# Altium footprint library IC.PcbLib: 386 footprints (part 13 of 30)
Each footprint in its own frame and in the unit in brackets; x right, y up, seen from the top. Pads: shape width x height; smd on the part's side, far side on the other; paste and mask are expansions set on the pad; w line width, h text height; cw(c..) or ccw(c..) is an arc to the next point about the centre after c.
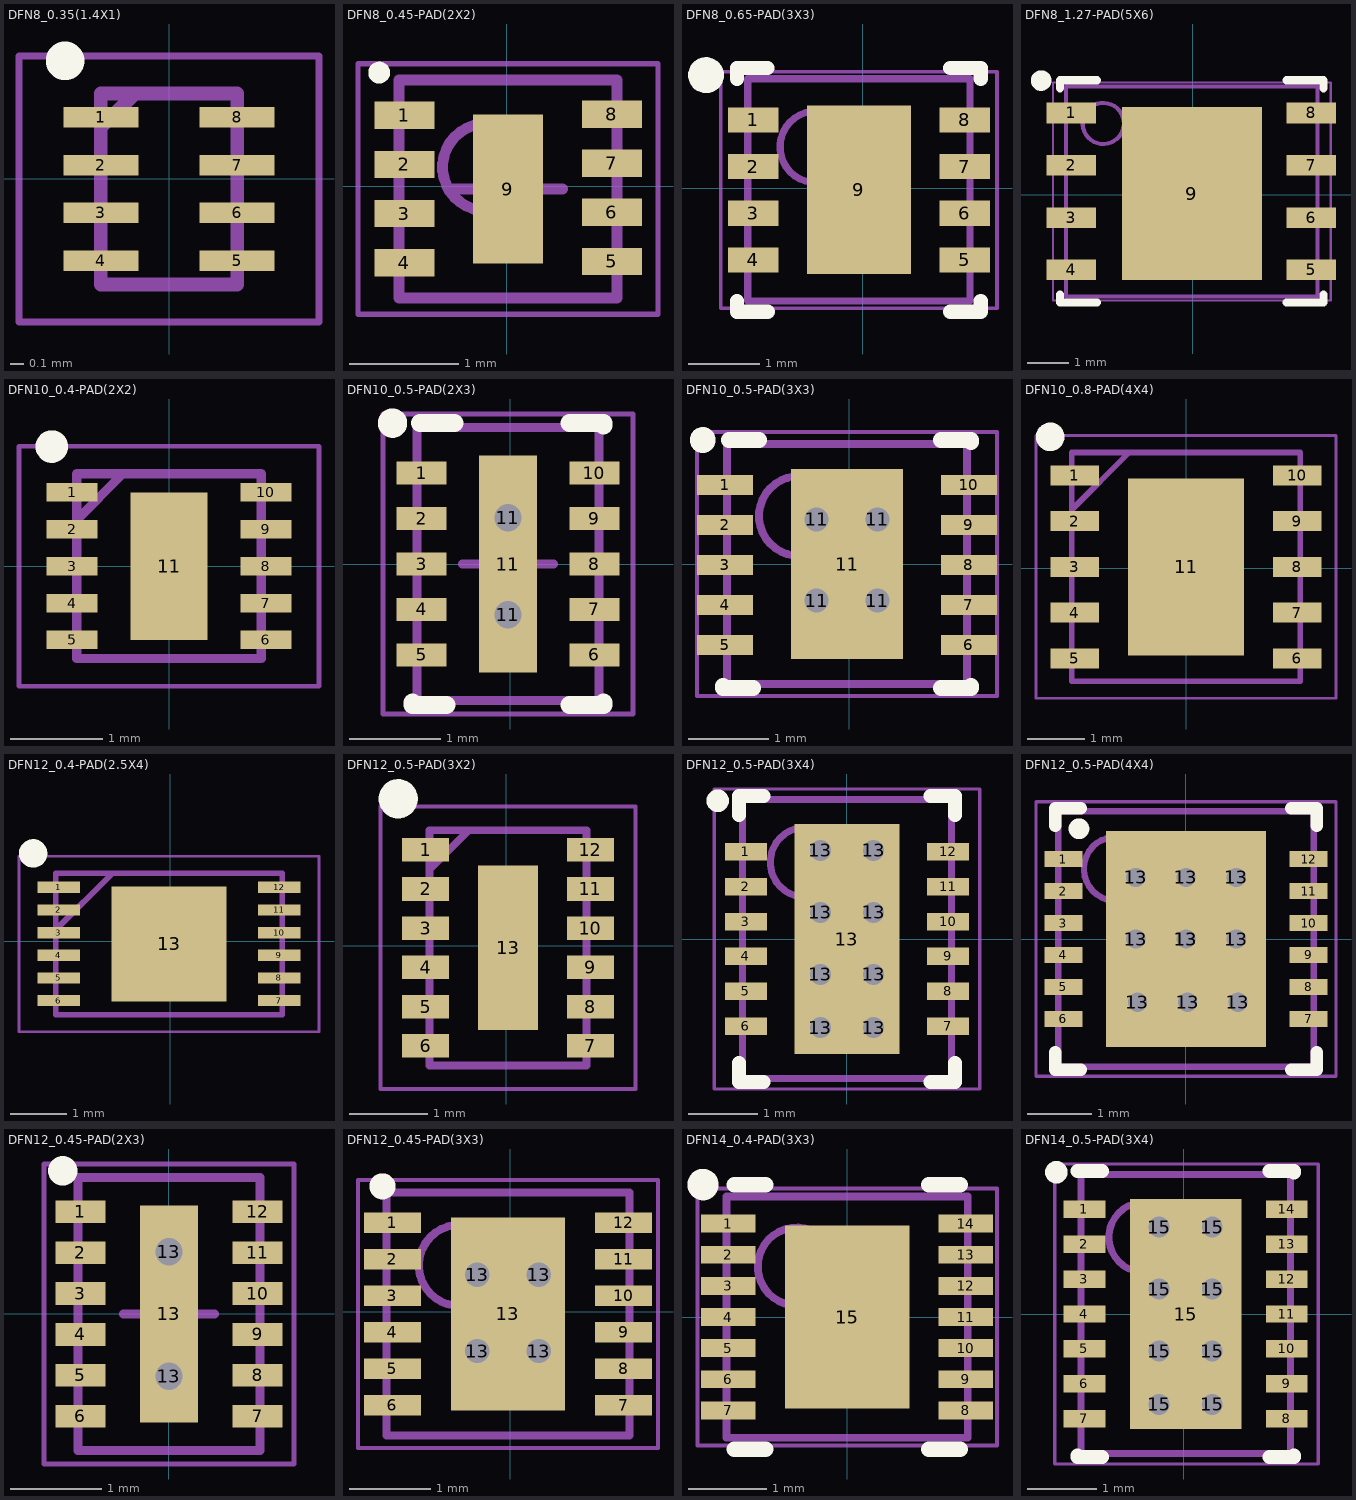
[diagram p12: the footprints below, top view; thin cyan lines are the x and y axes]

## DFN8_0.35(1.4X1) [mm]
pads (8):
  rect 0.55x0.15 smd: 1(-0.5,0.449) 2(-0.5,0.099) 3(-0.5,-0.251) 4(-0.5,-0.601) 5(0.5,-0.601) 6(0.5,-0.251) 7(0.5,0.099) 8(0.5,0.449)
Top Overlay:
  circle w0.25: c-0.762,0.864 r0.016
Mechanical 13:
  lines w0.1: -0.5,0.374 -0.25,0.624 ; -0.5,-0.776 0.5,-0.776 0.5,0.624 -0.5,0.624 -0.5,-0.776
Mechanical 15:
  lines w0.05: -1.1,-1.051 1.1,-1.051 1.1,0.899 -1.1,0.899 -1.1,-1.051
3D body "TXS0102DQER.stp": height 0.4, standoff 0, extent -0.55,-0.776 0.55,0.624

## DFN8_0.45-PAD(2X2) [mm]
pads (9):
  rect 0.55x0.25 smd: 1(-0.938,0.65)
  rect 0.55x0.25 smd mask+0.102: 2(-0.938,0.2) 3(-0.938,-0.25) 4(-0.938,-0.7) 5(0.965,-0.69) 6(0.965,-0.24) 7(0.965,0.21) 8(0.965,0.66)
  rect 0.64x1.37 smd mask+0.102: 9(0.013,-0.025)
Top Overlay:
  circle w0.1: c-1.168,1.041 r0.05
Mechanical 13:
  circle w0.1: c-0.187,0.175 r0.4
  lines w0.1: -0.987,-1.025 1.013,-1.025 1.013,0.975 -0.987,0.975 -0.987,-1.025
Mechanical 15:
  lines w0.05: -1.362,-1.175 1.388,-1.175 1.388,1.125 -1.362,1.125 -1.362,-1.175
  lines w0.1: -0.487,-0.025 0.513,-0.025 ; 0.013,-0.525 0.013,0.475
3D body "User Library-DFN 8.step": height 0.76, standoff -0.04, extent -0.988,-1.025 1.014,0.975

## DFN8_0.65-PAD(3X3) [mm]
pads (9):
  rect 0.7x0.35 smd: 1(-1.526,0.95) 2(-1.526,0.3) 3(-1.526,-0.35) 4(-1.526,-1) 5(1.424,-1) 6(1.424,-0.35) 7(1.424,0.3) 8(1.424,0.95)
  rect 1.45x2.35 smd: 9(-0.051,-0.025)
Top Overlay:
  circle w0.25: c-2.184,1.575 r0.125
  lines w0.2: -1.751,-1.575 -1.751,-1.725 -1.325,-1.725 ; -1.751,1.525 -1.751,1.675 -1.325,1.675 ; 1.223,-1.725 1.649,-1.725 1.649,-1.575 ; 1.224,1.675 1.649,1.675 1.649,1.525
Mechanical 13:
  circle w0.1: c-0.651,0.575 r0.5
  lines w0.1: -1.601,-1.575 1.499,-1.575 1.499,1.525 -1.601,1.525 -1.601,-1.575
Mechanical 15:
  lines w0.05: -1.976,-1.675 1.874,-1.675 1.874,1.625 -1.976,1.625 -1.976,-1.675
  lines w0.1: -0.551,-0.025 0.449,-0.025 ; -0.051,-0.525 -0.051,0.475
3D body "User Library-DFN8_3x3mm__65mm.step": height 0.8, standoff 0, extent -1.575,-1.5 1.445,1.5

## DFN8_1.27-PAD(5X6) [mm]
pads (9):
  rect 1.2x0.5 smd: 1(-2.953,1.981) 2(-2.953,0.711) 3(-2.953,-0.559) 4(-2.953,-1.829) 5(2.877,-1.829) 6(2.877,-0.559) 7(2.877,0.711) 8(2.877,1.981)
  rect 3.4x4.2 smd: 9(-0.025,0.025)
Top Overlay:
  circle w0.25: c-3.683,2.769 r0.125
  lines w0.2: -3.225,-2.429 -3.225,-2.624 -2.325,-2.624 ; -3.225,2.581 -3.225,2.776 -2.325,2.776 ; 2.275,-2.624 3.175,-2.624 3.175,-2.429 ; 2.275,2.776 3.175,2.776 3.175,2.581
Mechanical 13:
  circle w0.1: c-2.175,1.726 r0.5
  lines w0.1: -3.075,-2.474 3.025,-2.474 3.025,2.626 -3.075,2.626 -3.075,-2.474
Mechanical 15:
  lines w0.05: -3.4,-2.574 3.35,-2.574 3.35,2.726 -3.4,2.726 -3.4,-2.574
  lines w0.1: -0.525,0.076 0.475,0.076 ; -0.025,-0.424 -0.025,0.576
3D body: height 1.1, standoff 0.1, extent -2.657,1.43 -1.86,2.228
3D body: height 1, standoff 0, extent -3.075,-2.474 3.025,2.626

## DFN10_0.4-PAD(2X2) [mm]
pads (11):
  rect 0.55x0.2 smd: 1(-1.05,0.8) 2(-1.05,0.4) 3(-1.05,0) 4(-1.05,-0.4) 5(-1.05,-0.8) 6(1.05,-0.8) 7(1.05,-0.4) 8(1.05,0) 9(1.05,0.4) 10(1.05,0.8)
  rect 0.838x1.6 smd: 11(0,0)
Top Overlay:
  circle w0.25: c-1.27,1.295 r0.051
Mechanical 13:
  lines w0.1: -1,0.5 -0.5,1 ; -1,-1 1,-1 1,1 -1,1 -1,-1
Mechanical 15:
  lines w0.05: -1.625,-1.3 1.625,-1.3 1.625,1.3 -1.625,1.3 -1.625,-1.3
3D body "BQ24040DSQT.stp": height 0.8, standoff 0, extent -1.05,-1 1.05,1

## DFN10_0.5-PAD(2X3) [mm]
pads (13):
  rect 0.55x0.25 smd: 1(-0.976,1) 2(-0.976,0.5) 3(-0.976,0) 4(-0.976,-0.5) 5(-0.976,-1) 6(0.925,-1) 7(0.925,-0.5) 8(0.925,0) 9(0.925,0.5) 10(0.925,1)
  round 0.6 hole 0.3: 11(-0.025,-0.559) 11(-0.025,0.508)
  rect 0.64x2.39 smd: 11(-0.025,0)
Top Overlay:
  circle w0.25: c-1.295,1.549 r0.036
  lines w0.2: -1.075,-1.525 -1.075,-1.55 -0.7,-1.55 ; -0.991,1.549 -0.616,1.549 ; 0.65,-1.55 1.025,-1.55 1.025,-1.525 ; 0.65,1.55 1.025,1.55 1.025,1.525
Mechanical 13:
  lines w0.1: -1.025,-1.5 0.975,-1.5 0.975,1.5 -1.025,1.5 -1.025,-1.5
Mechanical 15:
  lines w0.05: -1.4,-1.65 1.35,-1.65 1.35,1.65 -1.4,1.65 -1.4,-1.65
  lines w0.1: -0.525,0 0.475,0 ; -0.025,-0.5 -0.025,0.5
3D body "User Library-My-DFN-10-3x2-0_5.STEP": height 0.8, standoff 0, extent -1.085,-1.55 1.035,1.55

## DFN10_0.5-PAD(3X3) [mm]
pads (15):
  rect 0.7x0.25 smd mask+0.102: 1(-1.549,0.991) 2(-1.549,0.491) 3(-1.549,-0.009) 4(-1.549,-0.509) 5(-1.549,-1.009) 6(1.499,-1.009) 7(1.499,-0.509) 8(1.499,-0.009) 9(1.499,0.491) 10(1.499,0.991)
  round 0.6 hole 0.3: 11(-0.406,-0.457) 11(-0.406,0.559) 11(0.356,-0.457) 11(0.356,0.559)
  rect 1.4x2.38 smd mask+0.102: 11(-0.025,0)
Top Overlay:
  circle w0.25: c-1.829,1.549 r0.036
  lines w0.2: -1.575,-1.525 -1.575,-1.55 -1.2,-1.55 ; -1.499,1.549 -1.124,1.549 ; 1.15,-1.55 1.525,-1.55 1.525,-1.525 ; 1.15,1.55 1.525,1.55 1.525,1.525
Mechanical 13:
  circle w0.1: c-0.625,0.6 r0.5
  lines w0.1: -1.525,-1.5 1.475,-1.5 1.475,1.5 -1.525,1.5 -1.525,-1.5
Mechanical 15:
  lines w0.05: -1.9,-1.65 1.85,-1.65 1.85,1.65 -1.9,1.65 -1.9,-1.65
  lines w0.1: -0.525,0 0.475,0 ; -0.025,-0.5 -0.025,0.5
3D body "User Library-DFN10_cdo.step": height 0.85, standoff 0, extent -1.575,-1.55 1.545,1.55

## DFN10_0.8-PAD(4X4) [mm]
height 1.1
pads (11):
  rect 0.85x0.35 smd: 1(-1.95,1.625) 2(-1.95,0.825) 3(-1.95,0.025) 4(-1.95,-0.775) 5(-1.95,-1.575) 6(1.95,-1.575) 7(1.95,-0.775) 8(1.95,0.025) 9(1.95,0.825) 10(1.95,1.625)
  rect 2.032x3.1 smd: 11(0,0.025)
Top Overlay:
  circle w0.25: c-2.375,2.3 r0.125
Mechanical 13:
  lines w0.1: -2,1.025 -1,2.025 ; -2,-1.975 2,-1.975 2,2.025 -2,2.025 -2,-1.975
Mechanical 15:
  lines w0.05: -2.625,-2.275 2.625,-2.275 2.625,2.325 -2.625,2.325 -2.625,-2.275
3D body "LM5010ASD_NOPB.stp": height 0.8, standoff 0, extent -2.05,-1.975 2.05,2.025

## DFN12_0.4-PAD(2.5X4) [mm]
pads (13):
  rect 0.75x0.2 smd: 1(-1.975,0.949) 2(-1.975,0.549) 3(-1.975,0.149) 4(-1.975,-0.251) 5(-1.975,-0.651) 6(-1.975,-1.051) 7(1.925,-1.051) 8(1.925,-0.651) 9(1.925,-0.251) 10(1.925,0.149) 11(1.925,0.549) 12(1.925,0.949)
  rect 2.032x2.032 smd: 13(-0.025,-0.051)
Top Overlay:
  circle w0.25: c-2.425,1.549 r0.125
Mechanical 13:
  lines w0.1: -2.025,0.199 -1.025,1.199 ; -2.025,-1.301 1.975,-1.301 1.975,1.199 -2.025,1.199 -2.025,-1.301
Mechanical 15:
  lines w0.05: -2.675,-1.601 2.625,-1.601 2.625,1.499 -2.675,1.499 -2.675,-1.601
3D body "BQ28Z610DRZT.stp": height 1, standoff 0, extent -2.075,-1.301 2.025,1.199

## DFN12_0.5-PAD(3X2) [mm]
pads (13):
  rect 0.6x0.3 smd: 1(-1.025,1.225) 2(-1.025,0.725) 3(-1.025,0.225) 4(-1.025,-0.275) 5(-1.025,-0.775) 6(-1.025,-1.275) 7(1.075,-1.275) 8(1.075,-0.775) 9(1.075,-0.275) 10(1.075,0.225) 11(1.075,0.725) 12(1.075,1.225)
  rect 0.762x2.1 smd: 13(0.025,-0.025)
Top Overlay:
  circle w0.25: c-1.375,1.875 r0.125
Mechanical 13:
  lines w0.1: -0.975,0.975 -0.475,1.475 ; -0.975,-1.525 1.025,-1.525 1.025,1.475 -0.975,1.475 -0.975,-1.525
Mechanical 15:
  lines w0.05: -1.6,-1.825 1.65,-1.825 1.65,1.775 -1.6,1.775 -1.6,-1.825
3D body "TPS627451DSST.stp": height 0.8, standoff 0, extent -1.025,-1.525 1.075,1.475

## DFN12_0.5-PAD(3X4) [mm]
pads (21):
  rect 0.6x0.25 smd: 1(-1.45,1.25) 2(-1.45,0.75) 3(-1.45,0.25) 4(-1.45,-0.25) 5(-1.45,-0.75) 6(-1.45,-1.25) 7(1.45,-1.25) 8(1.45,-0.75) 9(1.45,-0.25) 10(1.45,0.25) 11(1.45,0.75) 12(1.45,1.25)
  round 0.6 hole 0.3: 13(-0.381,-1.27) 13(-0.381,-0.508) 13(-0.381,0.381) 13(-0.381,1.27) 13(0.381,-1.27) 13(0.381,-0.508) 13(0.381,0.381) 13(0.381,1.27)
  rect 1.5x3.3 smd: 13(0,0)
Top Overlay:
  circle w0.25: c-1.854,1.981 r0.036
  lines w0.2: -1.55,-1.775 -1.55,-2.05 -1.2,-2.05 ; -1.55,1.775 -1.55,2.05 -1.2,2.05 ; 1.2,-2.05 1.55,-2.05 1.55,-1.775 ; 1.2,2.05 1.55,2.05 1.55,1.775
Mechanical 13:
  circle w0.1: c-0.6,1.1 r0.5
  lines w0.1: -1.5,-2 1.5,-2 1.5,2 -1.5,2 -1.5,-2
Mechanical 15:
  lines w0.05: -1.9,-2.15 1.9,-2.15 1.9,2.15 -1.9,2.15 -1.9,-2.15
  lines w0.1: -0.5,0 0.5,0 ; 0,-0.5 0,0.5
3D body "User Library-My-DFN-12-4x3-0_5.STEP": height 0.8, standoff 0, extent -1.56,-2.05 1.56,2.05

## DFN12_0.5-PAD(4X4) [mm]
pads (22):
  rect 0.6x0.25 smd: 1(-1.92,1.25) 2(-1.92,0.75) 3(-1.92,0.25) 4(-1.92,-0.25) 5(-1.92,-0.75) 6(-1.92,-1.25) 7(1.92,-1.25) 8(1.92,-0.75) 9(1.92,-0.25) 10(1.92,0.25) 11(1.92,0.75) 12(1.92,1.25)
  round 0.6 hole 0.3: 13(-0.787,0) 13(-0.787,0.965) 13(-0.762,-0.991) 13(0,0) 13(0,0.965) 13(0.025,-0.991) 13(0.787,0) 13(0.787,0.965) 13(0.813,-0.991)
  rect 2.5x3.38 smd: 13(0,0)
Top Overlay:
  circle w0.25: c-1.676,1.727 r0.036
  lines w0.2: -2.05,-1.775 -2.05,-2.05 -1.65,-2.05 ; -2.05,1.775 -2.05,2.05 -1.65,2.05 ; 1.65,-2.05 2.05,-2.05 2.05,-1.775 ; 1.65,2.05 2.05,2.05 2.05,1.775
Mechanical 13:
  circle w0.1: c-1.1,1.1 r0.5
  lines w0.1: -2,-2 -2,2 2,2 2,-2 -2,-2
Mechanical 15:
  lines w0.05: -2.35,-2.15 -2.35,2.15 2.35,2.15 2.35,-2.15 -2.35,-2.15
  lines w0.1: -0.5,0 0.5,0 ; 0,-0.5 0,0.5
3D body "User Library-My-DFN-12-4x4-0_5.STEP": height 0.8, standoff 0, extent -2.06,-2.05 2.06,2.05

## DFN12_0.45-PAD(2X3) [mm]
pads (15):
  rect 0.55x0.25 smd mask+0.102: 1(-0.976,1.125) 2(-0.976,0.675) 3(-0.976,0.225) 4(-0.976,-0.225) 5(-0.976,-0.675) 6(-0.976,-1.125) 7(0.976,-1.125) 8(0.976,-0.675) 9(0.976,-0.225) 10(0.976,0.225) 11(0.976,0.675) 12(0.976,1.125)
  round 0.6 hole 0.3: 13(0,-0.686) 13(0,0.686)
  rect 0.64x2.39 smd mask+0.102: 13(0,0)
Top Overlay:
  circle w0.25: c-1.168,1.575 r0.036
Mechanical 13:
  lines w0.1: -1,-1.5 -1,1.5 1,1.5 1,-1.5 -1,-1.5
Mechanical 15:
  lines w0.05: -1.375,-1.65 -1.375,1.65 1.375,1.65 1.375,-1.65 -1.375,-1.65
  lines w0.1: -0.5,0 0.5,0 ; 0,-0.5 0,0.5
3D body "User Library-DFN-12DDB.STEP": height 0.77, standoff -0.04, extent -1.045,-1.501 0.995,1.499

## DFN12_0.45-PAD(3X3) [mm]
pads (17):
  rect 0.7x0.25 smd: 1(-1.451,1.1) 2(-1.451,0.65) 3(-1.451,0.2) 4(-1.451,-0.25) 5(-1.451,-0.7) 6(-1.451,-1.15) 7(1.4,-1.15) 8(1.4,-0.7) 9(1.4,-0.25) 10(1.4,0.2) 11(1.4,0.65) 12(1.4,1.1)
  round 0.6 hole 0.3: 13(-0.406,-0.483) 13(-0.406,0.457) 13(0.356,-0.483) 13(0.356,0.457)
  rect 1.4x2.38 smd: 13(-0.025,-0.025)
Top Overlay:
  circle w0.25: c-1.575,1.549 r0.036
Mechanical 13:
  circle w0.1: c-0.625,0.575 r0.5
  lines w0.1: -1.525,-1.525 -1.525,1.475 1.475,1.475 1.475,-1.525 -1.525,-1.525
Mechanical 15:
  lines w0.05: -1.875,-1.675 -1.875,1.625 1.825,1.625 1.825,-1.675 -1.875,-1.675
  lines w0.1: -0.525,-0.025 0.475,-0.025 ; -0.025,-0.525 -0.025,0.475
3D body "User Library-DFN12(3x3).step": height 0.76, standoff 0, extent -1.501,-1.525 1.501,1.475

## DFN14_0.4-PAD(3X3) [mm]
pads (15):
  rect 0.7x0.23 smd: 1(-1.526,1.2) 2(-1.526,0.8) 3(-1.526,0.4) 4(-1.526,0) 5(-1.526,-0.4) 6(-1.526,-0.8) 7(-1.526,-1.2) 8(1.526,-1.2) 9(1.526,-0.8) 10(1.526,-0.4) 11(1.526,0) 12(1.526,0.4) 13(1.526,0.8) 14(1.526,1.2)
  rect 1.6x2.35 smd: 15(0,0)
Top Overlay:
  circle w0.25: c-1.854,1.702 r0.076
  lines w0.2: -1.45,-1.7 -1.05,-1.7 ; -1.45,1.7 -1.05,1.7 ; 1.05,-1.7 1.45,-1.7 ; 1.05,1.7 1.45,1.7
Mechanical 13:
  circle w0.1: c-0.65,0.65 r0.5
  lines w0.1: -1.55,-1.55 -1.55,1.55 1.55,1.55 1.55,-1.55 -1.55,-1.55
Mechanical 15:
  lines w0.05: -1.925,-1.65 -1.925,1.65 1.925,1.65 1.925,-1.65 -1.925,-1.65
  lines w0.1: -0.5,0 0.5,0 ; 0,-0.5 0,0.5
3D body "SON40P300X80_HS-15N.step": height 0.8, standoff 0, extent -1.6,-1.5 1.6,1.5

## DFN14_0.5-PAD(3X4) [mm]
pads (23):
  rect 0.6x0.25 smd: 1(-1.425,1.5) 2(-1.425,1) 3(-1.425,0.5) 4(-1.425,0) 5(-1.425,-0.5) 6(-1.425,-1) 7(-1.425,-1.5) 8(1.475,-1.5) 9(1.475,-1) 10(1.475,-0.5) 11(1.475,0) 12(1.475,0.5) 13(1.475,1) 14(1.475,1.5)
  round 0.6 hole 0.3: 15(-0.356,-1.295) 15(-0.356,-0.533) 15(-0.356,0.356) 15(-0.356,1.245) 15(0.406,-1.295) 15(0.406,-0.533) 15(0.406,0.356) 15(0.406,1.245)
  rect 1.6x3.3 smd: 15(0.025,0)
Top Overlay:
  circle w0.25: c-1.829,2.032 r0.036
  lines w0.2: -1.525,-2.025 -1.525,-2.05 -1.175,-2.05 ; -1.525,2.05 -1.175,2.05 ; 1.225,-2.05 1.575,-2.05 1.575,-2.025 ; 1.225,2.05 1.575,2.05 1.575,2.025
Mechanical 13:
  circle w0.1: c-0.575,1.1 r0.5
  lines w0.1: -1.475,-2 -1.475,2 1.525,2 1.525,-2 -1.475,-2
Mechanical 15:
  lines w0.05: -1.854,-2.15 -1.854,2.15 1.925,2.15 1.925,-2.15 -1.854,-2.15
  lines w0.1: -0.475,0 0.525,0 ; 0.025,-0.5 0.025,0.5
3D body "User Library-My-DFN-14-4x3-0_5.STEP": height 0.8, standoff 0, extent -1.509,-2.05 1.611,2.05